# Altium footprint library PCBLIB.PcbLib: 557 footprints (part 9 of 36)
Each footprint in its own frame and in the unit in brackets; x right, y up, seen from the top. Pads: shape width x height; smd on the part's side, far side on the other; paste and mask are expansions set on the pad; w line width, h text height; cw(c..) or ccw(c..) is an arc to the next point about the centre after c.
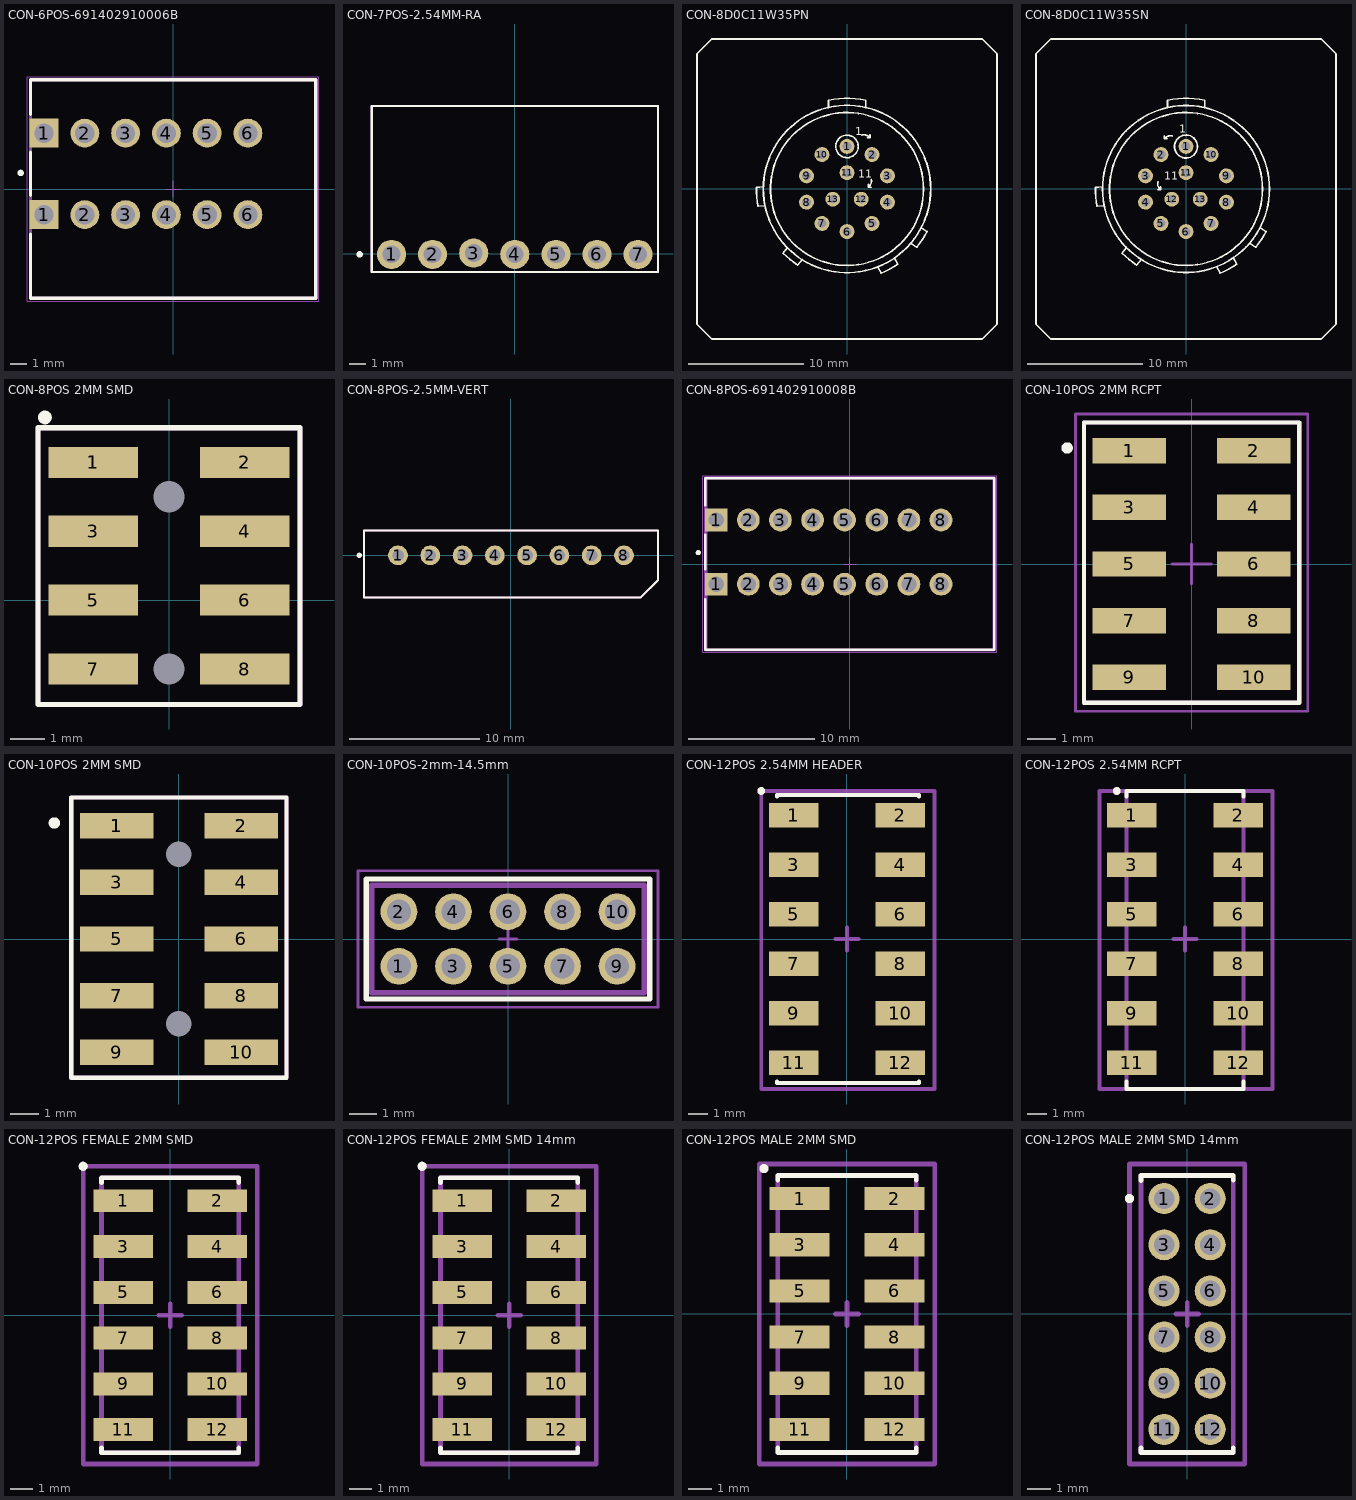
[diagram p8: the footprints below, top view; thin cyan lines are the x and y axes]

## CON-6POS-691402910006B [mm] "2.54 mm - Screwless Horizontal Entry - 06p"
height 12.8
pads (12):
  rect 1.8x1.8 hole 1.2: 1(-8.04,-1.6) 1(-8.04,3.48)
  round 1.8 hole 1.2: 2(-5.5,-1.6) 2(-5.5,3.48) 3(-2.96,-1.6) 3(-2.96,3.48) 4(-0.42,-1.6) 4(-0.42,3.48) 5(2.12,-1.6) 5(2.12,3.48) 6(4.66,-1.6) 6(4.66,3.48)
Top Overlay:
  circle w0.2: c-9.5,1 r0.1
  lines w0.2: -8.89,-2.8 -8.89,-6.8 8.89,-6.8 8.89,6.8 -8.89,6.8 -8.89,4.66 ; -8.89,-0.4 -8.89,2.3
Mechanical 13:
  lines w0.1: -8.89,-6.8 -8.89,6.8 8.89,6.8 8.89,-6.8 -8.89,-6.8
Mechanical 15:
  lines w0.05: -0.5,0 0.5,0 ; 0,-0.5 0,0.5 ; -9.09,-7 9.09,-7 9.09,7 -9.09,7 -9.09,-7
ASM Top:
  lines w0.2: -8.89,-6.8 8.89,-6.8 8.89,6.8 -8.89,6.8 -8.89,-6.8
  text ".designator" at -1.829,0 h0.8
3D body "691402910006B.stp": height 12.64, standoff -3.45, extent -8.89,-6.8 8.89,6.8

## CON-7POS-2.54MM-RA [mm]
pads (7):
  round 1.8 hole 1.1: 1(-7.616,-0.038) 2(-5.084,-0.038) 3(-2.544,0.038) 4(-0.004,-0.038) 5(2.536,-0.038) 6(5.076,-0.038) 7(7.616,-0.038)
Top Overlay:
  circle w0.2: c-9.593,-0.038 r0.1
  lines w0.152: -8.834,-1.13 -8.834,9.13 8.846,9.13 8.846,-1.13 -8.834,-1.13
ASM Top:
  lines w0.152: -8.834,-1.13 -8.834,9.13 8.846,9.13 8.846,-1.13 -8.834,-1.13
  text ".designator" at -0.994,4.1 h0.8
3D body "022052071.stp": height 6.31, standoff -3.14, extent -8.739,-1.13 8.787,9.043

## CON-8D0C11W35PN [mm] "8D 13C 13#22D PIN RECP"
pads (13):
  round 1.3 hole 0.75 mask+0.05: 1(0,3.71) 2(2.181,3.001) 3(3.528,1.146) 4(3.528,-1.146) 5(2.181,-3.001) 6(0,-3.71) 7(-2.181,-3.001) 8(-3.528,-1.146) 9(-3.528,1.146) 10(-2.181,3.001) 11(0,1.42) 12(1.24,-0.89) 13(-1.24,-0.89)
Top Overlay:
  circle w0.15: c0,3.71 r0.981
  circle w0.15: c0,0 r7.291
  circle w0.15: c0,0 r6.665
  lines w0.15: -7.28,0.191 -7.892,0.137 ccw(c0,0) -7.748,-1.507 -7.137,-1.453 ; -5.192,-5.11 -5.578,-5.587 ccw(c0,0) -4.295,-6.624 -3.91,-6.148 ; -1.618,7.106 -1.618,7.734 cw(c0,0) 1.632,7.731 1.63,7.106 ; 1.3,4.7 cw(c1.469,4.084) 1.98,4.467 2,4.467 2,4.7 ; 1.762,4.467 1.99,4.467 ; 1.875,0.167 1.875,0.396 ; 2.108,0.157 1.875,0.157 1.875,0.177 ccw(c1.492,0.689) 2.108,0.857 ; 2.679,-6.783 2.967,-7.325 ccw(c0,0) 4.423,-6.549 4.136,-6.008 ; 5.551,-4.734 6.06,-5.077 ccw(c0,0) 6.981,-3.709 6.473,-3.366 ; -13.07,-11.772 -13.07,11.772 -11.772,13.07 11.772,13.07 13.07,11.772 13.07,-11.772 11.772,-13.07 -11.772,-13.07 -13.07,-11.772
  text "1" at 0.7,4.7 h0.7
  text "11" at 1,1 h0.7
3D body "8D0C11W35PN_NOT-LISTED.stp": height 33.11, standoff -3.99, extent -13.075,-13.07 13.077,13.07

## CON-8D0C11W35SN [mm] "8D 13C 13#22D PIN RECP"
pads (13):
  round 1.3 hole 0.75 mask+0.05: 1(0,3.71) 2(-2.181,3.001) 3(-3.528,1.146) 4(-3.528,-1.146) 5(-2.181,-3.001) 6(0,-3.71) 7(2.181,-3.001) 8(3.528,-1.146) 9(3.528,1.146) 10(2.181,3.001) 11(0,1.42) 12(-1.24,-0.89) 13(1.24,-0.89)
Top Overlay:
  circle w0.15: c0,3.7 r1
  circle w0.15: c0,0 r7.278
  circle w0.15: c0,0 r6.665
  lines w0.15: -7.28,0.191 -7.892,0.137 ccw(c0,0) -7.748,-1.507 -7.136,-1.453 ; -5.192,-5.11 -5.578,-5.587 ccw(c0,0) -4.295,-6.624 -3.91,-6.148 ; -2.448,-0.062 -2.215,-0.062 ; -2.448,0.638 ccw(c-1.832,0.47) -2.215,-0.041 ; -2.215,-0.051 -2.215,0.177 ; -1.9,4.617 -1.9,4.383 -1.88,4.383 cw(c-1.369,4.001) -1.2,4.617 ; -1.89,4.383 -1.662,4.383 ; 1.632,7.106 1.632,7.731 ccw(c0,0) -1.618,7.734 ; 2.679,-6.783 2.967,-7.325 ccw(c0,0) 4.423,-6.549 4.136,-6.008 ; 5.551,-4.734 6.06,-5.077 ccw(c0,0) 6.981,-3.709 6.473,-3.366 ; -1.618,7.106 -1.618,7.734 ; -1.618,7.106 -1.618,7.106 ; -1.618,7.734 -1.618,7.734 ; -13.07,-11.772 -11.772,-13.07 11.772,-13.07 13.07,-11.772 13.07,11.772 11.772,13.07 -11.772,13.07 -13.07,11.772 -13.07,-11.772
  text "1" at -0.6,4.9 h0.7
  text "11" at -1.9,0.8 h0.7
3D body "8d0c11w35sn_NOT-LISTED.stp": height 33.11, standoff -4.03, extent -13.076,-13.07 13.077,13.07

## CON-8POS 2MM SMD [mm]
pads (11):
  rect 2.6x0.9 smd: 1(-2.2,4) 1(-2.2,4) 2(2.2,4) 3(-2.2,2) 4(2.2,2) 5(-2.2,0) 6(2.2,0) 7(-2.2,-2) 8(2.2,-2)
  round 0 hole 0.9 unplated mask+0: MP1(0,3) MP2(0,-2)
Top Overlay:
  circle w0.2: c-3.6,5.3 r0.1
  lines w0.15: -3.8,4.973 -3.8,-3.027 3.8,-3.027 3.8,4.973 ; -3.8,5 3.8,5
ASM Top:
  lines w0.15: -3.8,4.973 -3.8,-3.027 3.8,-3.027 3.8,4.973 ; -3.8,5 3.8,5
  text ".designator" at 0,1 h0.8
3D body "TMM-104-01-F-D-SM.stp": height 5.98, standoff 0.01, extent -3.53,-3 3.531,5

## CON-8POS-2.5MM-VERT [mil]
pads (8):
  round 60 hole 35: 1(-343,0) 2(-245,0) 3(-147,0) 4(-49,0) 5(49,0) 6(147,0) 7(245,0) 8(343,0)
Top Overlay:
  circle w7.87: c-460.63,0 r3.94
  lines w6: -445.63,-127.63 -445.63,75.37 446.37,75.37 446.37,-75.13 393.88,-127.63 -445.63,-127.63
ASM Top:
  lines w6: -446,-128 -446,75 446,75 446,-75.5 393.5,-128 -446,-128
  text ".designator" at -51.18,-23.62 h31.5
3D body "022035085.stp": height 231.14, standoff -138.94, extent -441,-122.46 440.89,70.46

## CON-8POS-691402910008B [mm] "2.54 mm - Screwless Horizontal Entry - 08p"
height 12.8
pads (16):
  rect 1.8x1.8 hole 1.2: 1(-10.58,-1.6) 1(-10.58,3.48)
  round 1.8 hole 1.2: 2(-8.04,-1.6) 2(-8.04,3.48) 3(-5.5,-1.6) 3(-5.5,3.48) 4(-2.96,-1.6) 4(-2.96,3.48) 5(-0.42,-1.6) 5(-0.42,3.48) 6(2.12,-1.6) 6(2.12,3.48) 7(4.66,-1.6) 7(4.66,3.48) 8(7.2,-1.6) 8(7.2,3.48)
Top Overlay:
  circle w0.2: c-12,0.9 r0.1
  lines w0.2: -11.43,-2.8 -11.43,-6.8 11.43,-6.8 11.43,6.8 -11.43,6.8 -11.43,4.66 ; -11.43,-0.4 -11.43,2.3
Mechanical 13:
  lines w0.1: -11.43,-6.8 11.43,-6.8 11.43,6.8 -11.43,6.8 -11.43,-6.8
Mechanical 15:
  lines w0.05: -0.5,0 0.5,0 ; 0,-0.5 0,0.5 ; -11.63,-7 -11.63,7 11.63,7 11.63,-7 -11.63,-7
ASM Top:
  lines w0.254: -11.4,-6.8 11.4,-6.8 11.4,6.8 -11.4,6.8 -11.4,-6.8
  text ".designator" at -0.2,0 h0.8
3D body "691402910008B.stp": height 12.64, standoff -3.45, extent -11.43,-6.8 11.43,6.8

## CON-10POS 2MM RCPT [mm]
pads (11):
  rect 2.6x0.9 smd: 1(-2.2,4) 1(-2.2,4) 2(2.2,4) 3(-2.2,2) 4(2.2,2) 5(-2.2,0) 6(2.2,0) 7(-2.2,-2) 8(2.2,-2) 9(-2.2,-4) 10(2.2,-4)
Top Overlay:
  circle w0.2: c-4.4,4.1 r0.1
  lines w0.15: -3.8,-4.9 -3.8,5 3.8,5 3.8,-4.9 -3.8,-4.9
Mechanical 15:
  lines w0.1: -0.7,0 0.7,0 ; 0,-0.7 0,0.7 ; -4.1,-5.2 4.1,-5.2 4.1,5.3 -4.1,5.3 -4.1,-5.2
ASM Top:
  lines w0.15: -3.8,-4.9 3.8,-4.9 3.8,5 -3.8,5 -3.8,-4.9
  text ".designator" at 0,1 h0.8
3D body "c-1-2314844-0-5-3d.stp": height 4.63, standoff -0.05, extent -3.331,-5 3.33,5

## CON-10POS 2MM SMD [mm]
pads (13):
  rect 2.6x0.9 smd: 1(-2.2,4) 1(-2.2,4) 2(2.2,4) 3(-2.2,2) 4(2.2,2) 5(-2.2,0) 6(2.2,0) 7(-2.2,-2) 8(2.2,-2) 9(-2.2,-4) 10(2.2,-4)
  round 0 hole 0.9 unplated mask+0: MP1(0,3) MP2(0,-3)
Top Overlay:
  circle w0.2: c-4.4,4.1 r0.1
  lines w0.15: -3.8,-4.9 -3.8,5 3.8,5 3.8,-4.9 -3.8,-4.9
ASM Top:
  lines w0.15: -3.8,-4.9 3.8,-4.9 3.8,5 -3.8,5 -3.8,-4.9
  text ".designator" at 0,1 h0.8
3D body "TMM-104-01-F-D-SM.stp": height 5.98, standoff 0.01, extent -3.53,-3 3.531,5

## CON-10POS-2mm-14.5mm [mil]
pads (10):
  round 53 hole 35 mask+3: 1(-157.48,-39.37) 2(-157.48,39.37) 3(-78.74,-39.37) 4(-78.74,39.37) 5(0,-39.37) 6(0,39.37) 7(78.74,-39.37) 8(78.74,39.37) 9(157.48,-39.37) 10(157.48,39.37)
Top Overlay:
  lines w7.87: -204.72,-86.61 -204.72,86.61 204.72,86.61 204.72,-86.61 -204.72,-86.61
Mechanical 15:
  lines w3.94: -12.87,0 12.87,0 ; 0,-12.87 0,12.87 ; -216.54,-98.43 -216.54,98.43 216.54,98.43 216.54,-98.43 -216.54,-98.43
ASM Top:
  lines w7.87: -196.85,-77.5 -196.85,77.5 196.85,77.5 196.85,-77.5 -196.85,-77.5
  text ".designator" at -3.94,0 h47.24
3D body "MTMM-105-14-L-D-571.stp": height 630.5, standoff -120.5, extent -196.86,-77.5 196.84,77.5

## CON-12POS 2.54MM HEADER [mm]
pads (12):
  rect 2.54x1.27 smd paste-0.05: 1(-2.73,6.35) 2(2.73,6.35) 3(-2.73,3.81) 4(2.73,3.81) 5(-2.73,1.27) 6(2.73,1.27) 7(-2.73,-1.27) 8(2.73,-1.27) 9(-2.73,-3.81) 10(2.73,-3.81) 11(-2.73,-6.35) 12(2.73,-6.35)
Top Overlay:
  circle w0.2: c-4.4,7.6 r0.1
  lines w0.2: -3.6,-7.3 -3.6,-7.4 3.7,-7.4 3.7,-7.3 ; -3.6,7.3 -3.6,7.4 ; -3.6,7.35 -3.6,7.4 ; 3.7,7.3 3.7,7.4 -3.6,7.4
Mechanical 15:
  lines w0.2: -0.6,0 0,0 ; 0,-0.6 0,0 ; 0,0.6 0,0 ; 0.6,0 0,0 ; -4.4,-7.7 -4.4,7.6 4.5,7.6 4.5,-7.7 -4.4,-7.7
ASM Top:
  lines w0.2: -4.4,-7.7 -4.4,7.6 4.5,7.6 4.5,-7.7 -4.4,-7.7
  text ".designator" at 0.2,-2.1 h0.8
3D body "95278_y01_12_asm.stp": height 9.67, standoff 0.01, extent -3.6,-7.42 3.686,7.42

## CON-12POS 2.54MM RCPT [mm]
pads (12):
  rect 2.54x1.27 smd paste-0.05: 1(-2.73,6.35) 2(2.73,6.35) 3(-2.73,3.81) 4(2.73,3.81) 5(-2.73,1.27) 6(2.73,1.27) 7(-2.73,-1.27) 8(2.73,-1.27) 9(-2.73,-3.81) 10(2.73,-3.81) 11(-2.73,-6.35) 12(2.73,-6.35)
Top Overlay:
  circle w0.2: c-3.5,7.6 r0.1
  lines w0.2: -3,-7.3 -3,-7.7 3,-7.7 3,-7.3 ; -3,7.3 -3,7.6 3,7.6 3,7.3
Mechanical 15:
  lines w0.2: -0.6,0 0,0 ; 0,-0.6 0,0 ; 0,0.6 0,0 ; 0.6,0 0,0 ; -4.4,-7.7 4.5,-7.7 4.5,7.6 -4.4,7.6 -4.4,-7.7
ASM Top:
  circle w0.2: c-3.5,7.6 r0.1
  lines w0.2: -3,-7.7 3,-7.7 3,7.6 -3,7.6 -3,-7.7
  text ".designator" at 0.2,-2.1 h0.8
3D body "89898-306a_asm.stp": height 8.21, standoff 0.01, extent -3.016,-7.63 3.016,7.53

## CON-12POS FEMALE 2MM SMD [mm]
pads (12):
  rect 2.6x1 smd: 1(-2.05,5) 2(2.05,5) 3(-2.05,3) 4(2.05,3) 5(-2.05,1) 6(2.05,1) 7(-2.05,-1) 8(2.05,-1) 9(-2.05,-3) 10(2.05,-3) 11(-2.05,-5) 12(2.05,-5)
Top Overlay:
  circle w0.2: c-3.799,6.507 r0.1
  lines w0.2: -3,-5.8 -3,-6 -2.15,-6 3,-6 3,-5.8 ; -3,5.8 -3,6 2.15,6 3,6 3,5.8
Mechanical 15:
  lines w0.2: -0.5,0 0.5,0 ; 0,-0.5 0,0.5 ; -3.8,-6.5 -3.8,6.5 3.8,6.5 3.8,-6.5 -3.8,-6.5
ASM Top:
  lines w0.2: -3,-6 3,-6 3,6 -3,6 -3,-6
  text ".designator" at -0.1,-0.1 h0.8
3D body "55510-x12_asm.stp": height 5.59, standoff 0.19, extent -3,-5.96 3,5.96

## CON-12POS FEMALE 2MM SMD 14mm [mm]
pads (12):
  rect 2.6x1 smd: 1(-2.05,5) 2(2.05,5) 3(-2.05,3) 4(2.05,3) 5(-2.05,1) 6(2.05,1) 7(-2.05,-1) 8(2.05,-1) 9(-2.05,-3) 10(2.05,-3) 11(-2.05,-5) 12(2.05,-5)
Top Overlay:
  circle w0.2: c-3.799,6.507 r0.1
  lines w0.2: -3,-5.8 -3,-6 -2.15,-6 3,-6 3,-5.8 ; -3,5.8 -3,6 2.15,6 3,6 3,5.8
Mechanical 15:
  lines w0.2: -0.5,0 0.5,0 ; 0,-0.5 0,0.5 ; -3.8,-6.5 -3.8,6.5 3.8,6.5 3.8,-6.5 -3.8,-6.5
ASM Top:
  lines w0.2: -3,-6 3,-6 3,6 -3,6 -3,-6
  text ".designator" at -0.1,-0.1 h0.8
3D body "c-1-2314844-2-5-3d.stp": height 4.63, standoff -0.05, extent -3.33,-6 3.33,6

## CON-12POS MALE 2MM SMD [mm]
pads (12):
  rect 2.6x1 smd: 1(-2.05,5) 2(2.05,5) 3(-2.05,3) 4(2.05,3) 5(-2.05,1) 6(2.05,1) 7(-2.05,-1) 8(2.05,-1) 9(-2.05,-3) 10(2.05,-3) 11(-2.05,-5) 12(2.05,-5)
Top Overlay:
  circle w0.2: c-3.599,6.3 r0.1
  lines w0.2: -3,-5.8 -3,-6 -2.15,-6 3,-6 3,-5.8 ; -3,5.8 -3,6 2.15,6 3,6 3,5.8
Mechanical 15:
  lines w0.2: -0.5,0 0.5,0 ; 0,-0.5 0,0.5 ; -3.8,-6.5 -3.8,6.5 3.8,6.5 3.8,-6.5 -3.8,-6.5
ASM Top:
  lines w0.2: -3,-6 3,-6 3,6 -3,6 -3,-6
  text ".designator" at -0.1,-0.1 h0.8
3D body "57202-G52-06LFc.stp": height 6.51, standoff 0.01, extent -3.002,-6 3.003,6

## CON-12POS MALE 2MM SMD 14mm [mil]
pads (12):
  round 53 hole 35 mask+3: 1(-39.37,196.85) 2(39.37,196.85) 3(-39.37,118.11) 4(39.37,118.11) 5(-39.37,39.37) 6(39.37,39.37) 7(-39.37,-39.37) 8(39.37,-39.37) 9(-39.37,-118.11) 10(39.37,-118.11) 11(-39.37,-196.85) 12(39.37,-196.85)
Top Overlay:
  circle w7.87: c-98.43,196.85 r3.94
  lines w7.87: -78.74,-228.35 -78.74,-236.22 78.74,-236.22 78.74,-228.35 ; -78.74,227.12 -78.74,235 ; -78.74,236.22 78.74,236.22 78.74,228.35
Mechanical 15:
  lines w7.87: -19.68,0 19.68,0 ; 0,-19.68 0,19.68 ; -98.43,-255.91 -98.43,255.9 98.43,255.9 98.43,-255.91 -98.43,-255.91
ASM Top:
  lines w7.87: -78.74,-236.22 78.74,-236.22 78.74,236.22 -78.74,236.22 -78.74,-236.22
  text ".designator" at -3.94,-3.94 h31.5
3D body "MTMM-106-14-T-D-570.stp": height 629.5, standoff -121.5, extent -77.49,-236.21 77.51,236.23